# Altium footprint library SMPSProject.PcbLib: 143 footprints (part 1 of 9)
Each footprint in its own frame and in the unit in brackets; x right, y up, seen from the top. Pads: shape width x height; smd on the part's side, far side on the other; paste and mask are expansions set on the pad; w line width, h text height; cw(c..) or ccw(c..) is an arc to the next point about the centre after c.
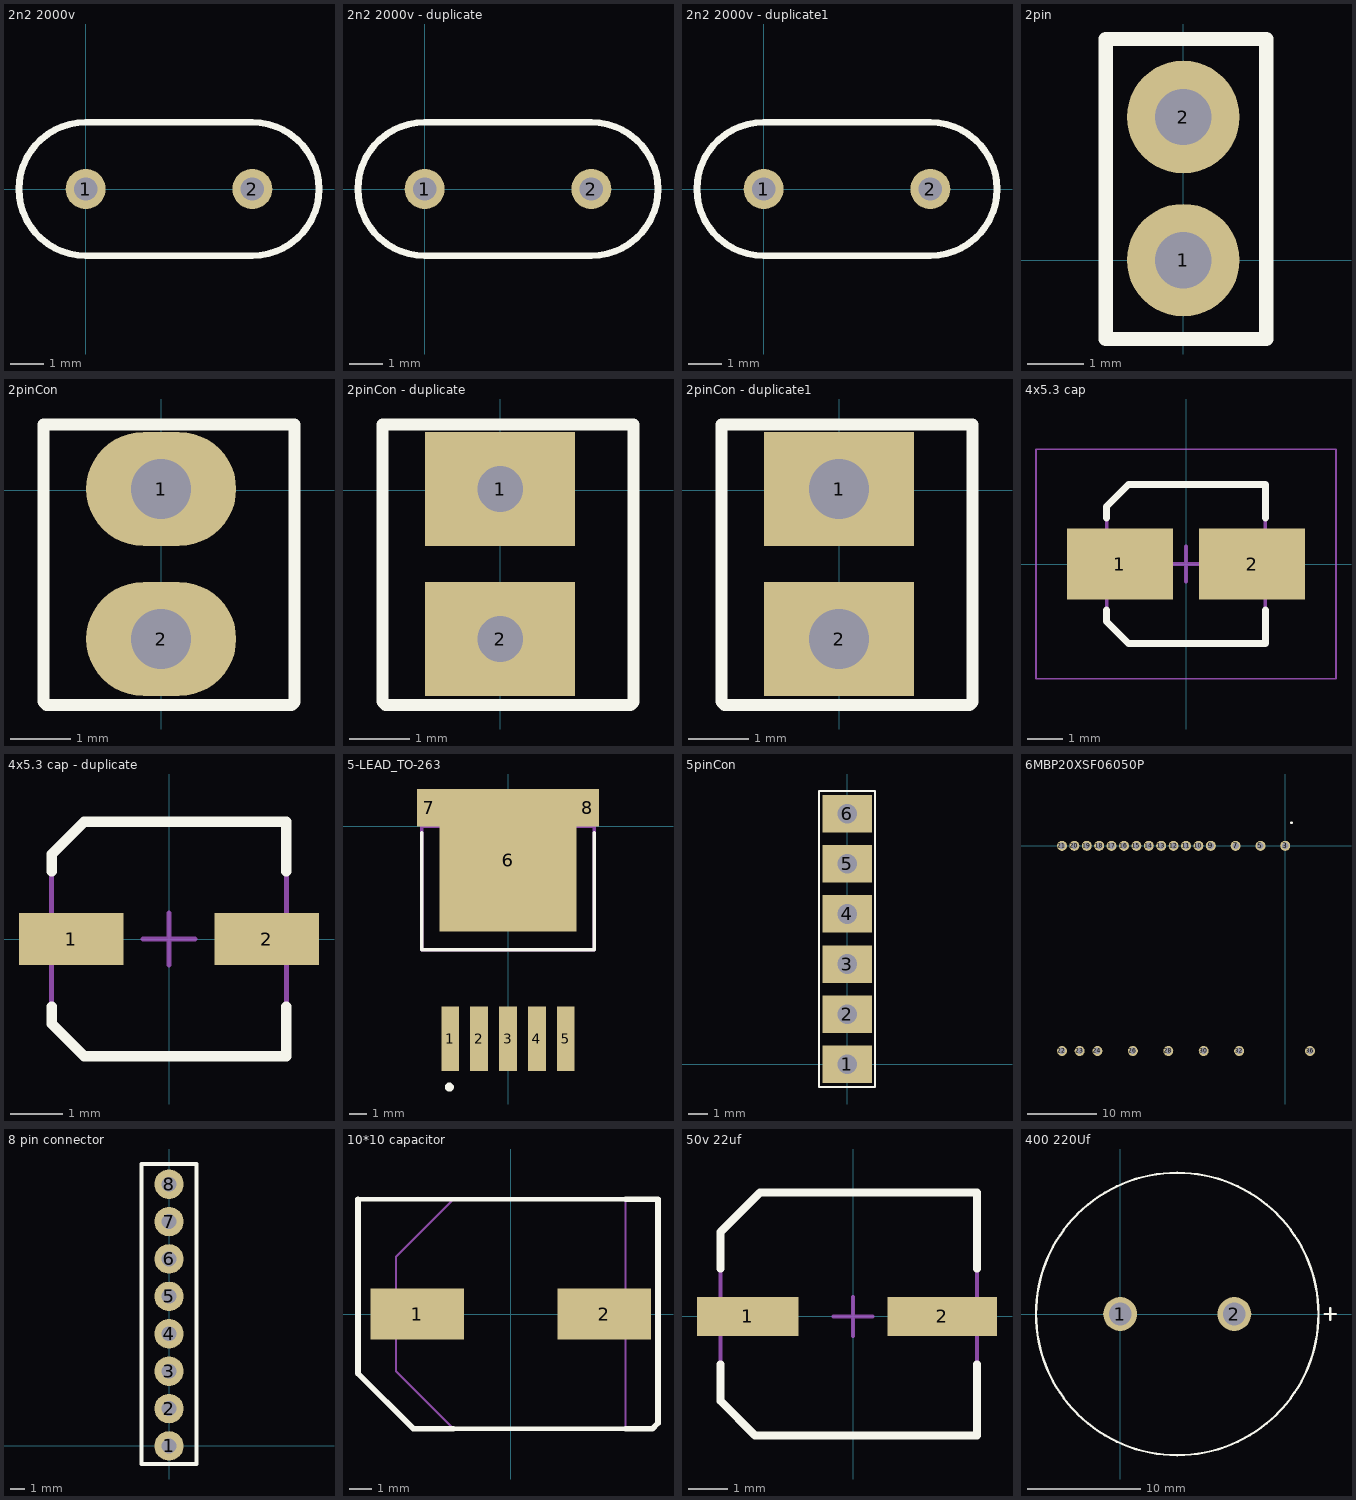
[diagram p0: the footprints below, top view; thin cyan lines are the x and y axes]

## 2n2 2000v [mm]
pads (2):
  round 1.2 hole 0.7: 1(0,0) 2(5,0)
Top Overlay:
  lines w0.2: 0,-2 cw(c0,0) 0,2 5,2 cw(c5,0) 5,-2 0,-2
3D body "User Library-TDK_CAP_CK45_.STEP": height 12.5, standoff -5, extent -3.046,-2.475 7.947,2.525

## 2n2 2000v - duplicate [mm]
pads (2):
  round 1.2 hole 0.7: 1(0,0) 2(5,0)
Top Overlay:
  lines w0.2: 0,-2 cw(c0,0) 0,2 5,2 cw(c5,0) 5,-2 0,-2
3D body "User Library-TDK_CAP_CK45_.STEP": height 12.5, standoff -5, extent -3.046,-2.475 7.947,2.525

## 2n2 2000v - duplicate1 [mm]
pads (2):
  round 1.2 hole 0.7: 1(0,0) 2(5,0)
Top Overlay:
  lines w0.2: 0,-2 cw(c0,0) 0,2 5,2 cw(c5,0) 5,-2 0,-2
3D body "User Library-TDK_CAP_CK45_.STEP": height 12.5, standoff -5, extent -3.046,-2.475 7.947,2.525

## 2pin [mm]
pads (2):
  round 2 hole 1: 1(0,0) 2(0,2.54)
Top Overlay:
  lines w0.254: -1.375,-1.4 1.475,-1.4 1.475,3.925 -1.375,3.925 -1.375,-1.4

## 2pinCon [mm]
pads (2):
  oval 2.5x1.9 hole 1 square: 1(0,0.025) 2(0,-2.475)
Top Overlay:
  lines w0.2: -1.965,-3.52 -1.965,1.1 2.225,1.1 2.225,-3.525 2.175,-3.575 -1.91,-3.575 -1.965,-3.52
3D body "User Library-Molex - 2-Pin Header with Lock (0_100in pitch).STEP": height 10.68, standoff -3.54, extent -3.302,-3.81 3.048,1.27

## 2pinCon - duplicate [mm]
pads (2):
  rect 2.5x1.9 hole 0.762 square: 1(0,0.025) 2(0,-2.475)
Top Overlay:
  lines w0.2: -1.965,-3.52 -1.91,-3.575 2.175,-3.575 2.225,-3.525 2.225,1.1 -1.965,1.1 -1.965,-3.52
3D body "User Library-Molex - 2-Pin Header with Lock (0_100in pitch).STEP": height 10.68, standoff -3.54, extent -3.302,-3.81 3.048,1.27

## 2pinCon - duplicate1 [mm]
pads (2):
  rect 2.5x1.9 hole 1: 1(0,0.025) 2(0,-2.475)
Top Overlay:
  lines w0.2: -1.965,-3.52 -1.965,1.1 2.225,1.1 2.225,-3.525 2.175,-3.575 -1.91,-3.575 -1.965,-3.52
3D body "User Library-Molex - 2-Pin Header with Lock (0_100in pitch).STEP": height 10.68, standoff -3.54, extent -3.302,-3.81 3.048,1.27

## 4x5.3 cap [mm]
height 5.5
pads (2):
  rect 3x2 smd: 1(-1.875,0) 2(1.875,0)
Top Overlay:
  lines w0.2: -2.25,-1.3 -2.25,-1.625 -1.625,-2.25 2.25,-2.25 2.25,-1.3 ; -2.25,1.3 -2.25,1.625 -1.625,2.25 2.25,2.25 2.25,1.3
Top Courtyard:
  lines w0.05: -4.25,-3.25 -4.25,3.25 4.25,3.25 4.25,-3.25 -4.25,-3.25
  lines w0.1: -0.5,0 0.5,0 ; 0,-0.5 0,0.5
Top Assembly:
  lines w0.1: -2.25,-1.625 -1.625,-2.25 2.25,-2.25 2.25,2.25 -1.625,2.25 -2.25,1.625 -2.25,-1.625
3D body "User Library-4x5_4.step": height 5.71, standoff 0.01, extent -2.633,-2.15 2.667,2.15

## 4x5.3 cap - duplicate [mm]
height 5.5
pads (2):
  rect 2x1 smd: 1(-1.875,0) 2(1.875,0)
Top Overlay:
  lines w0.2: -2.25,-1.3 -2.25,-1.625 -1.625,-2.25 2.25,-2.25 2.25,-1.3 ; -2.25,1.3 -2.25,1.625 -1.625,2.25 2.25,2.25 2.25,1.3
Top Courtyard:
  lines w0.1: -0.5,0 0.5,0 ; 0,-0.5 0,0.5
Top Assembly:
  lines w0.1: -2.25,-1.625 -2.25,1.625 -1.625,2.25 2.25,2.25 2.25,-2.25 -1.625,-2.25 -2.25,-1.625
3D body "User Library-4x5_4.step": height 5.71, standoff 0.01, extent -2.633,-2.15 2.667,2.15

## 5-LEAD_TO-263 [mm]
pads (8):
  rect 1.05x3.8 smd: 1(-3.404,-12.5) 2(-1.702,-12.5) 3(0,-12.5) 4(1.702,-12.5) 5(3.404,-12.5)
  rect 8.05x8.4 smd: 6(0,-2)
  rect 1.35x2.2 smd: 7(-4.675,1.1) 8(4.675,1.1)
Top Overlay:
  circle w0.3: c-3.455,-15.36 r0.113
  lines w0.2: -5.08,-0.379 -5.08,-7.26 5.08,-7.26 5.08,-0.379
Mechanical 13:
  lines w0.2: -5.08,-7.26 5.08,-7.26 5.08,0 -5.08,0 -5.08,-7.26

## 5pinCon [mm]
pads (6):
  rect 2.5x1.9 hole 1: 1(0,0) 2(0,2.54) 3(0,5.08) 4(0,7.62) 5(0,10.16) 6(0,12.7)
Top Overlay:
  lines w0.1: -1.436,-1.143 -1.436,13.843 1.423,13.843 1.423,-1.143 0.261,-1.143 -0.741,-1.143 -1.436,-1.143

## 6MBP20XSF06050P [mm]
pads (24):
  round 1.431 hole 0.92: 3(0,0) 5(-3.556,0) 7(-7.112,0) 9(-10.668,0) 10(-12.446,0) 11(-14.224,0) 12(-16.002,0) 13(-17.78,0) 14(-19.558,0) 15(-21.336,0) 16(-23.114,0) 17(-24.892,0) 18(-26.67,0) 19(-28.448,0) 20(-30.226,0) 21(-32.004,0) 22(-32.004,-29.4) 23(-29.464,-29.4) 24(-26.924,-29.4) 26(-21.844,-29.4) 28(-16.764,-29.4) 30(-11.684,-29.4) 32(-6.604,-29.4) 36(3.556,-29.4)
Top Overlay:
  lines w0.2: 0.776,3.3 cw(c0.876,3.3) 0.976,3.3 cw(c0.876,3.3) 0.776,3.3
Bottom Overlay:
  lines w0.1: -35.724,-27.7 -35.724,-1.778 7.276,-1.778 7.276,-27.7 -35.724,-27.7

## 8 pin connector [mm]
pads (8):
  round 2 hole 1: 1(0,0) 2(0,2.54) 3(0,5.08) 4(0,7.62) 5(0,10.16) 6(0,12.7) 7(0,15.24) 8(0,17.78)
Top Overlay:
  lines w0.254: -1.875,-1.225 -1.875,19.15 1.875,19.15 1.875,-1.225 -1.875,-1.225

## 10*10 capacitor [mm]
pads (2):
  rect 4.2x2.3 smd: 1(-4.2,0) 2(4.2,0)
Top Overlay:
  lines w0.2: -6.858,5.15 5.15,5.15 ; -2.575,-5.15 5.15,-5.15
  lines w0.254: -6.858,5.15 -6.858,1.27 -6.858,-2.667 -4.375,-5.15 -2.575,-5.15 ; 5.15,-5.15 6.35,-5.15 6.604,-4.896 6.604,5.15 5.15,5.15
Mechanical 13:
  lines w0.1: -5.15,-2.575 -5.15,2.575 -2.575,5.15 5.15,5.15 5.15,-5.15 -2.575,-5.15 -5.15,-2.575
3D body "VZH331M1VTR-1010K.stp": height 10.5, standoff 0, extent -5.6,-5.25 5.6,5.25

## 50v 22uf [mm] "Aluminum Electrolytic Capacitor, Body 6.70x6.70x6.30mm, IPC Low Density"
height 6.3
pads (2):
  rect 2.6x1 smd: 1(-2.7,0)
  rect 2.8x1 smd: 2(2.286,0)
Top Overlay:
  lines w0.2: -3.4,-1.225 -3.4,-2.163 -2.515,-3.048 3.175,-3.048 3.175,-1.225 ; -3.4,1.225 -3.4,2.163 -2.387,3.175 3.175,3.175 3.175,1.225
Top Courtyard:
  lines w0.1: -0.5,0 0.5,0 ; 0,-0.5 0,0.5
Top Assembly:
  lines w0.1: -3.4,-2.163 -3.4,2.163 -2.387,3.175 3.175,3.175 3.175,-3.048 -2.515,-3.048 -3.4,-2.163
3D body "User Library-Nichicon_CW6_3x7.STEP": height 6.92, standoff 0.01, extent -3.627,-3.173 3.373,3.427

## 400 220Uf [mm]
pads (2):
  round 3 hole 2: 1(0,0) 2(10.1,0)
Top Overlay:
  circle w0.2: c5.05,0 r12.5
  lines w0.2: 18.082,0 19.098,0 ; 18.59,-0.508 18.59,0.508
3D body "U1-YY.step": height 49.77, standoff -5.58, extent -6.045,-11.176 15.951,10.82